# Altium integrated library WE_WR-TBL_Spring Clamp System_2.54 mm_rev15d.IntLib: 28 symbols
Pins are listed as number, name and electrical type; pins without a type are passive.

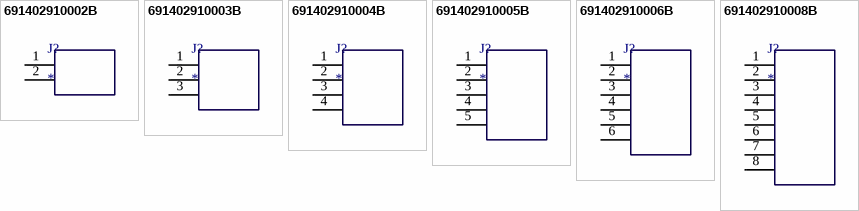
[diagram p0: symbols 691402910002B to 691402910008B]

## 691402910002B
designator J?
WR-TBL Screwless Entry Horizontal,Serie 4029 B - 2.54 mm; Manufacturer: Würth Elektronik eiSos GmbH; partNo: 691402910002B; ComponentLink1 Description: Manufacturer; ComponentLink2 Description: Datasheet; NoPins: 4; ComponentLink1URL: http://www.we-online.de; ComponentLink2URL: http://katalog.we-online.de/em/datasheet/6914029100xxB.pdf; Created by: Karrer Zheng; Created Date: 10/10/2014
footprint 691402910002B
pins: 1  , 2  

## 691402910003B
designator J?
WR-TBL Screwless Entry Horizontal,Serie 4029 B - 2.54 mm; Manufacturer: Würth Elektronik eiSos GmbH; partNo: 691402910003B; ComponentLink1 Description: Manufacturer; ComponentLink2 Description: Datasheet; NoPins: 6; ComponentLink1URL: http://www.we-online.de; ComponentLink2URL: http://katalog.we-online.de/em/datasheet/6914029100xxB.pdf; Created by: Karrer Zheng; Created Date: 10/10/2014
footprint 691402910003B
pins: 1  , 2  , 3  

## 691402910004B
designator J?
WR-TBL Screwless Entry Horizontal,Serie 4029 B - 2.54 mm; Manufacturer: Würth Elektronik eiSos GmbH; partNo: 691402910004B; ComponentLink1 Description: Manufacturer; ComponentLink2 Description: Datasheet; NoPins: 8; ComponentLink1URL: http://www.we-online.de; ComponentLink2URL: http://katalog.we-online.de/em/datasheet/6914029100xxB.pdf; Created by: Karrer Zheng; Created Date: 10/10/2014
footprint 691402910004B
pins: 1  , 2  , 3  , 4  

## 691402910005B
designator J?
WR-TBL Screwless Entry Horizontal,Serie 4029 B - 2.54 mm; Manufacturer: Würth Elektronik eiSos GmbH; partNo: 691402910005B; ComponentLink1 Description: Manufacturer; ComponentLink2 Description: Datasheet; NoPins: 10; ComponentLink1URL: http://www.we-online.de; ComponentLink2URL: http://katalog.we-online.de/em/datasheet/6914029100xxB.pdf; Created by: Karrer Zheng; Created Date: 10/10/2014
footprint 691402910005B
pins: 1  , 2  , 3  , 4  , 5  

## 691402910006B
designator J?
WR-TBL Screwless Entry Horizontal,Serie 4029 B - 2.54 mm; Manufacturer: Würth Elektronik eiSos GmbH; partNo: 691402910006B; ComponentLink1 Description: Manufacturer; ComponentLink2 Description: Datasheet; NoPins: 12; ComponentLink1URL: http://www.we-online.de; ComponentLink2URL: http://katalog.we-online.de/em/datasheet/6914029100xxB.pdf; Created by: Karrer Zheng; Created Date: 10/10/2014
footprint 691402910006B
pins: 1  , 2  , 3  , 4  , 5  , 6  

## 691402910008B
designator J?
WR-TBL Screwless Entry Horizontal,Serie 4029 B - 2.54 mm; Manufacturer: Würth Elektronik eiSos GmbH; partNo: 691402910008B; ComponentLink1 Description: Manufacturer; ComponentLink2 Description: Datasheet; NoPins: 16; ComponentLink1URL: http://www.we-online.de; ComponentLink2URL: http://katalog.we-online.de/em/datasheet/6914029100xxB.pdf; Created by: Karrer Zheng; Created Date: 10/10/2014
footprint 691402910008B
pins: 1  , 2  , 3  , 4  , 5  , 6  , 7  , 8  


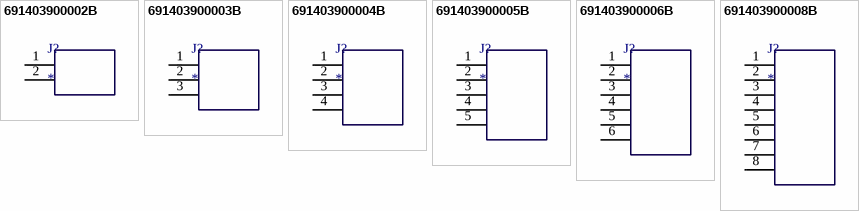
[diagram p1: symbols 691403900002B to 691403900008B]

## 691403900002B
designator J?
WR-TBL Screwless Entry Vertical,Serie 4039 B - 2.54 mm; Manufacturer: Würth Elektronik eiSos GmbH; partNo: 691403900002B; ComponentLink1 Description: Manufacturer; ComponentLink2 Description: Datasheet; NoPins: 4; ComponentLink1URL: http://www.we-online.de; ComponentLink2URL: http://katalog.we-online.de/em/datasheet/6914039000xx.pdf; Created by: Karrer Zheng; Created Date: 10/10/2014
footprint 691403900002B
pins: 1  , 2  

## 691403900003B
designator J?
WR-TBL Screwless Entry Vertical,Serie 4039 B - 2.54 mm; Manufacturer: Würth Elektronik eiSos GmbH; partNo: 691403900003B; ComponentLink1 Description: Manufacturer; ComponentLink2 Description: Datasheet; NoPins: 6; ComponentLink1URL: http://www.we-online.de; ComponentLink2URL: http://katalog.we-online.de/em/datasheet/6914039000xx.pdf; Created by: Karrer Zheng; Created Date: 10/10/2014
footprint 691403900003B
pins: 1  , 2  , 3  

## 691403900004B
designator J?
WR-TBL Screwless Entry Vertical,Serie 4039 B - 2.54 mm; Manufacturer: Würth Elektronik eiSos GmbH; partNo: 691403900004B; ComponentLink1 Description: Manufacturer; ComponentLink2 Description: Datasheet; NoPins: 8; ComponentLink1URL: http://www.we-online.de; ComponentLink2URL: http://katalog.we-online.de/em/datasheet/6914039000xx.pdf; Created by: Karrer Zheng; Created Date: 10/10/2014
footprint 691403900004B
pins: 1  , 2  , 3  , 4  

## 691403900005B
designator J?
WR-TBL Screwless Entry Vertical,Serie 4039 B - 2.54 mm; Manufacturer: Würth Elektronik eiSos GmbH; partNo: 691403900005B; ComponentLink1 Description: Manufacturer; ComponentLink2 Description: Datasheet; NoPins: 10; ComponentLink1URL: http://www.we-online.de; ComponentLink2URL: http://katalog.we-online.de/em/datasheet/6914039000xx.pdf; Created by: Karrer Zheng; Created Date: 10/10/2014
footprint 691403900005B
pins: 1  , 2  , 3  , 4  , 5  

## 691403900006B
designator J?
WR-TBL Screwless Entry Vertical,Serie 4039 B - 2.54 mm; Manufacturer: Würth Elektronik eiSos GmbH; partNo: 691403900006B; ComponentLink1 Description: Manufacturer; ComponentLink2 Description: Datasheet; NoPins: 12; ComponentLink1URL: http://www.we-online.de; ComponentLink2URL: http://katalog.we-online.de/em/datasheet/6914039000xx.pdf; Created by: Karrer Zheng; Created Date: 10/10/2014
footprint 691403900006B
pins: 1  , 2  , 3  , 4  , 5  , 6  

## 691403900008B
designator J?
WR-TBL Screwless Entry Vertical,Serie 4039 B - 2.54 mm; Manufacturer: Würth Elektronik eiSos GmbH; partNo: 691403900008B; ComponentLink1 Description: Manufacturer; ComponentLink2 Description: Datasheet; NoPins: 16; ComponentLink1URL: http://www.we-online.de; ComponentLink2URL: http://katalog.we-online.de/em/datasheet/6914039000xx.pdf; Created by: Karrer Zheng; Created Date: 10/10/2014
footprint 691403900008B
pins: 1  , 2  , 3  , 4  , 5  , 6  , 7  , 8  


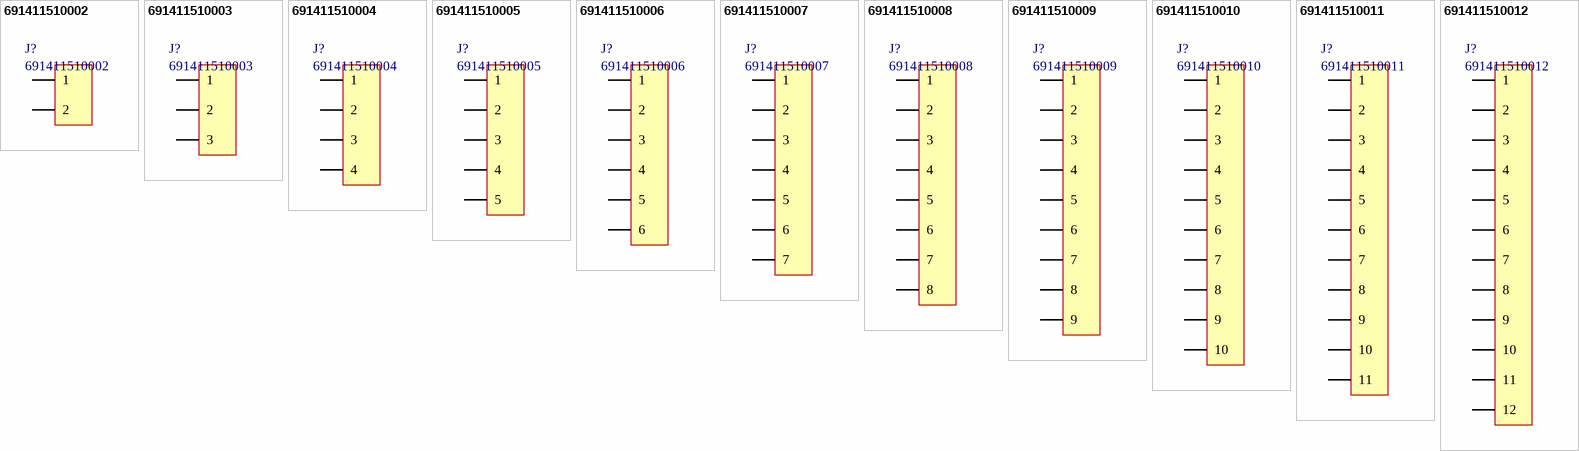
[diagram p2: symbols 691411510002 to 691411510012]

## 691411510002
designator J?
Horizontal Cable Entry Screwless, Serie 4115 - 5.08 mm; Manufacturer: Wurth Elektronik; ComponentLink1 Description: Manufacturer; ComponentLink2 Description: Datasheet; NoPins: 2; ComponentLink1 URL: http://www.we-online.com; ComponentLink2 URL: http://katalog.we-online.de/em/datasheet/6914115100xx.pdf; Created By: Baojun Chen; Created Date: 29.Aug.2015; PartNo: 691411510002
footprint 691411510002 (Serie 4115 - 5.08 mm _ 2 pins)
pins: 1, 2

## 691411510003
designator J?
Horizontal Cable Entry Screwless, Serie 4115 - 5.08 mm; Manufacturer: Wurth Elektronik; ComponentLink1 Description: Manufacturer; ComponentLink2 Description: Datasheet; NoPins: 3; ComponentLink1 URL: http://www.we-online.com; ComponentLink2 URL: http://katalog.we-online.de/em/datasheet/6914115100xx.pdf; Created By: Baojun Chen; Created Date: 29.Aug.2015; PartNo: 691411510003
footprint 691411510003 (Serie 4115 - 5.08 mm _ 3 pins)
pins: 1, 2, 3

## 691411510004
designator J?
Horizontal Cable Entry Screwless, Serie 4115 - 5.08 mm; Manufacturer: Wurth Elektronik; ComponentLink1 Description: Manufacturer; ComponentLink2 Description: Datasheet; NoPins: 4; ComponentLink1 URL: http://www.we-online.com; ComponentLink2 URL: http://katalog.we-online.de/em/datasheet/6914115100xx.pdf; Created By: Baojun Chen; Created Date: 29.Aug.2015; PartNo: 691411510004
footprint 691411510004 (Serie 4115 - 5.08 mm _ 4 pins)
pins: 1, 2, 3, 4

## 691411510005
designator J?
Horizontal Cable Entry Screwless, Serie 4115 - 5.08 mm; Manufacturer: Wurth Elektronik; ComponentLink1 Description: Manufacturer; ComponentLink2 Description: Datasheet; NoPins: 5; ComponentLink1 URL: http://www.we-online.com; ComponentLink2 URL: http://katalog.we-online.de/em/datasheet/6914115100xx.pdf; Created By: Baojun Chen; Created Date: 29.Aug.2015; PartNo: 691411510005
footprint 691411510005 (Serie 4115 - 5.08 mm _ 5 pins)
pins: 1, 2, 3, 4, 5

## 691411510006
designator J?
Horizontal Cable Entry Screwless, Serie 4115 - 5.08 mm; Manufacturer: Wurth Elektronik; ComponentLink1 Description: Manufacturer; ComponentLink2 Description: Datasheet; NoPins: 6; ComponentLink1 URL: http://www.we-online.com; ComponentLink2 URL: http://katalog.we-online.de/em/datasheet/6914115100xx.pdf; Created By: Baojun Chen; Created Date: 29.Aug.2015; PartNo: 691411510006
footprint 691411510006 (Serie 4115 - 5.08 mm _ 6 pins)
pins: 1, 2, 3, 4, 5, 6

## 691411510007
designator J?
Horizontal Cable Entry Screwless, Serie 4115 - 5.08 mm; Manufacturer: Wurth Elektronik; ComponentLink1 Description: Manufacturer; ComponentLink2 Description: Datasheet; NoPins: 7; ComponentLink1 URL: http://www.we-online.com; ComponentLink2 URL: http://katalog.we-online.de/em/datasheet/6914115100xx.pdf; Created By: Baojun Chen; Created Date: 29.Aug.2015; PartNo: 691411510007
footprint 691411510007 (Serie 4115 - 5.08 mm _ 7 pins)
pins: 1, 2, 3, 4, 5, 6, 7

## 691411510008
designator J?
Horizontal Cable Entry Screwless, Serie 4115 - 5.08 mm; Manufacturer: Wurth Elektronik; ComponentLink1 Description: Manufacturer; ComponentLink2 Description: Datasheet; NoPins: 8; ComponentLink1 URL: http://www.we-online.com; ComponentLink2 URL: http://katalog.we-online.de/em/datasheet/6914115100xx.pdf; Created By: Baojun Chen; Created Date: 29.Aug.2015; PartNo: 691411510008
footprint 691411510008 (Serie 4115 - 5.08 mm _ 8 pins)
pins: 1, 2, 3, 4, 5, 6, 7, 8

## 691411510009
designator J?
Horizontal Cable Entry Screwless, Serie 4115 - 5.08 mm; Manufacturer: Wurth Elektronik; ComponentLink1 Description: Manufacturer; ComponentLink2 Description: Datasheet; NoPins: 9; ComponentLink1 URL: http://www.we-online.com; ComponentLink2 URL: http://katalog.we-online.de/em/datasheet/6914115100xx.pdf; Created By: Baojun Chen; Created Date: 29.Aug.2015; PartNo: 691411510009
footprint 691411510009 (Serie 4115 - 5.08 mm _ 9 pins)
pins: 1, 2, 3, 4, 5, 6, 7, 8, 9

## 691411510010
designator J?
Horizontal Cable Entry Screwless, Serie 4115 - 5.08 mm; Manufacturer: Wurth Elektronik; ComponentLink1 Description: Manufacturer; ComponentLink2 Description: Datasheet; NoPins: 10; ComponentLink1 URL: http://www.we-online.com; ComponentLink2 URL: http://katalog.we-online.de/em/datasheet/6914115100xx.pdf; Created By: Baojun Chen; Created Date: 29.Aug.2015; PartNo: 691411510010
footprint 691411510010 (Serie 4115 - 5.08 mm _ 10 pins)
pins: 1, 2, 3, 4, 5, 6, 7, 8, 9, 10

## 691411510011
designator J?
Horizontal Cable Entry Screwless, Serie 4115 - 5.08 mm; Manufacturer: Wurth Elektronik; ComponentLink1 Description: Manufacturer; ComponentLink2 Description: Datasheet; NoPins: 11; ComponentLink1 URL: http://www.we-online.com; ComponentLink2 URL: http://katalog.we-online.de/em/datasheet/6914115100xx.pdf; Created By: Baojun Chen; Created Date: 29.Aug.2015; PartNo: 691411510011
footprint 691411510011 (Serie 4115 - 5.08 mm _ 11 pins)
pins: 1, 2, 3, 4, 5, 6, 7, 8, 9, 10, 11

## 691411510012
designator J?
Horizontal Cable Entry Screwless, Serie 4115 - 5.08 mm; Manufacturer: Wurth Elektronik; ComponentLink1 Description: Manufacturer; ComponentLink2 Description: Datasheet; NoPins: 12; ComponentLink1 URL: http://www.we-online.com; ComponentLink2 URL: http://katalog.we-online.de/em/datasheet/6914115100xx.pdf; Created By: Baojun Chen; Created Date: 29.Aug.2015; PartNo: 691411510012
footprint 691411510012 (Serie 4115 - 5.08 mm _ 12 pins)
pins: 1, 2, 3, 4, 5, 6, 7, 8, 9, 10, 11, 12


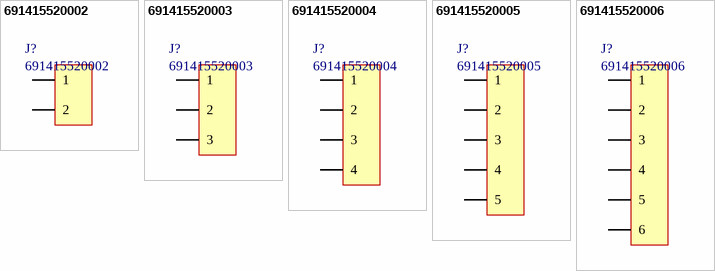
[diagram p3: symbols 691415520002 to 691415520006]

## 691415520002
designator J?
45° Cable Entry Screwless, Serie 4155 - 5.08 mm; Manufacturer: Wurth Elektronik; ComponentLink1 Description: Manufacturer; ComponentLink2 Description: Datasheet; NoPins: 2; ComponentLink1 URL: http://www.we-online.com; ComponentLink2 URL: http://katalog.we-online.de/em/datasheet/6914155200xx.pdf; Created By: Baojun Chen; Created Date: 29.Aug.2015; PartNo: 691415520002
footprint 691415520002 (Serie 4155 - 5.08 mm _ 2 pins)
pins: 1, 2

## 691415520003
designator J?
45° Cable Entry Screwless, Serie 4155 - 5.08 mm; Manufacturer: Wurth Elektronik; ComponentLink1 Description: Manufacturer; ComponentLink2 Description: Datasheet; NoPins: 3; ComponentLink1 URL: http://www.we-online.com; ComponentLink2 URL: http://katalog.we-online.de/em/datasheet/6914155200xx.pdf; Created By: Baojun Chen; Created Date: 29.Aug.2015; PartNo: 691415520003
footprint 691415520003 (Serie 4155 - 5.08 mm _ 3 pins)
pins: 1, 2, 3

## 691415520004
designator J?
45° Cable Entry Screwless, Serie 4155 - 5.08 mm; Manufacturer: Wurth Elektronik; ComponentLink1 Description: Manufacturer; ComponentLink2 Description: Datasheet; NoPins: 4; ComponentLink1 URL: http://www.we-online.com; ComponentLink2 URL: http://katalog.we-online.de/em/datasheet/6914155200xx.pdf; Created By: Baojun Chen; Created Date: 29.Aug.2015; PartNo: 691415520004
footprint 691415520004 (Serie 4155 - 5.08 mm _ 4 pins)
pins: 1, 2, 3, 4

## 691415520005
designator J?
45° Cable Entry Screwless, Serie 4155 - 5.08 mm; Manufacturer: Wurth Elektronik; ComponentLink1 Description: Manufacturer; ComponentLink2 Description: Datasheet; NoPins: 5; ComponentLink1 URL: http://www.we-online.com; ComponentLink2 URL: http://katalog.we-online.de/em/datasheet/6914155200xx.pdf; Created By: Baojun Chen; Created Date: 29.Aug.2015; PartNo: 691415520005
footprint 691415520005 (Serie 4155 - 5.08 mm _ 5 pins)
pins: 1, 2, 3, 4, 5

## 691415520006
designator J?
45° Cable Entry Screwless, Serie 4155 - 5.08 mm; Manufacturer: Wurth Elektronik; ComponentLink1 Description: Manufacturer; ComponentLink2 Description: Datasheet; NoPins: 6; ComponentLink1 URL: http://www.we-online.com; ComponentLink2 URL: http://katalog.we-online.de/em/datasheet/6914155200xx.pdf; Created By: Baojun Chen; Created Date: 29.Aug.2015; PartNo: 691415520006
footprint 691415520006 (Serie 4155 - 5.08 mm _ 6 pins)
pins: 1, 2, 3, 4, 5, 6